# Altium footprint library capacitors.PcbLib: 59 footprints (part 3 of 4)
Each footprint in its own frame and in the unit in brackets; x right, y up, seen from the top. Pads: shape width x height; smd on the part's side, far side on the other; paste and mask are expansions set on the pad; w line width, h text height; cw(c..) or ccw(c..) is an arc to the next point about the centre after c.
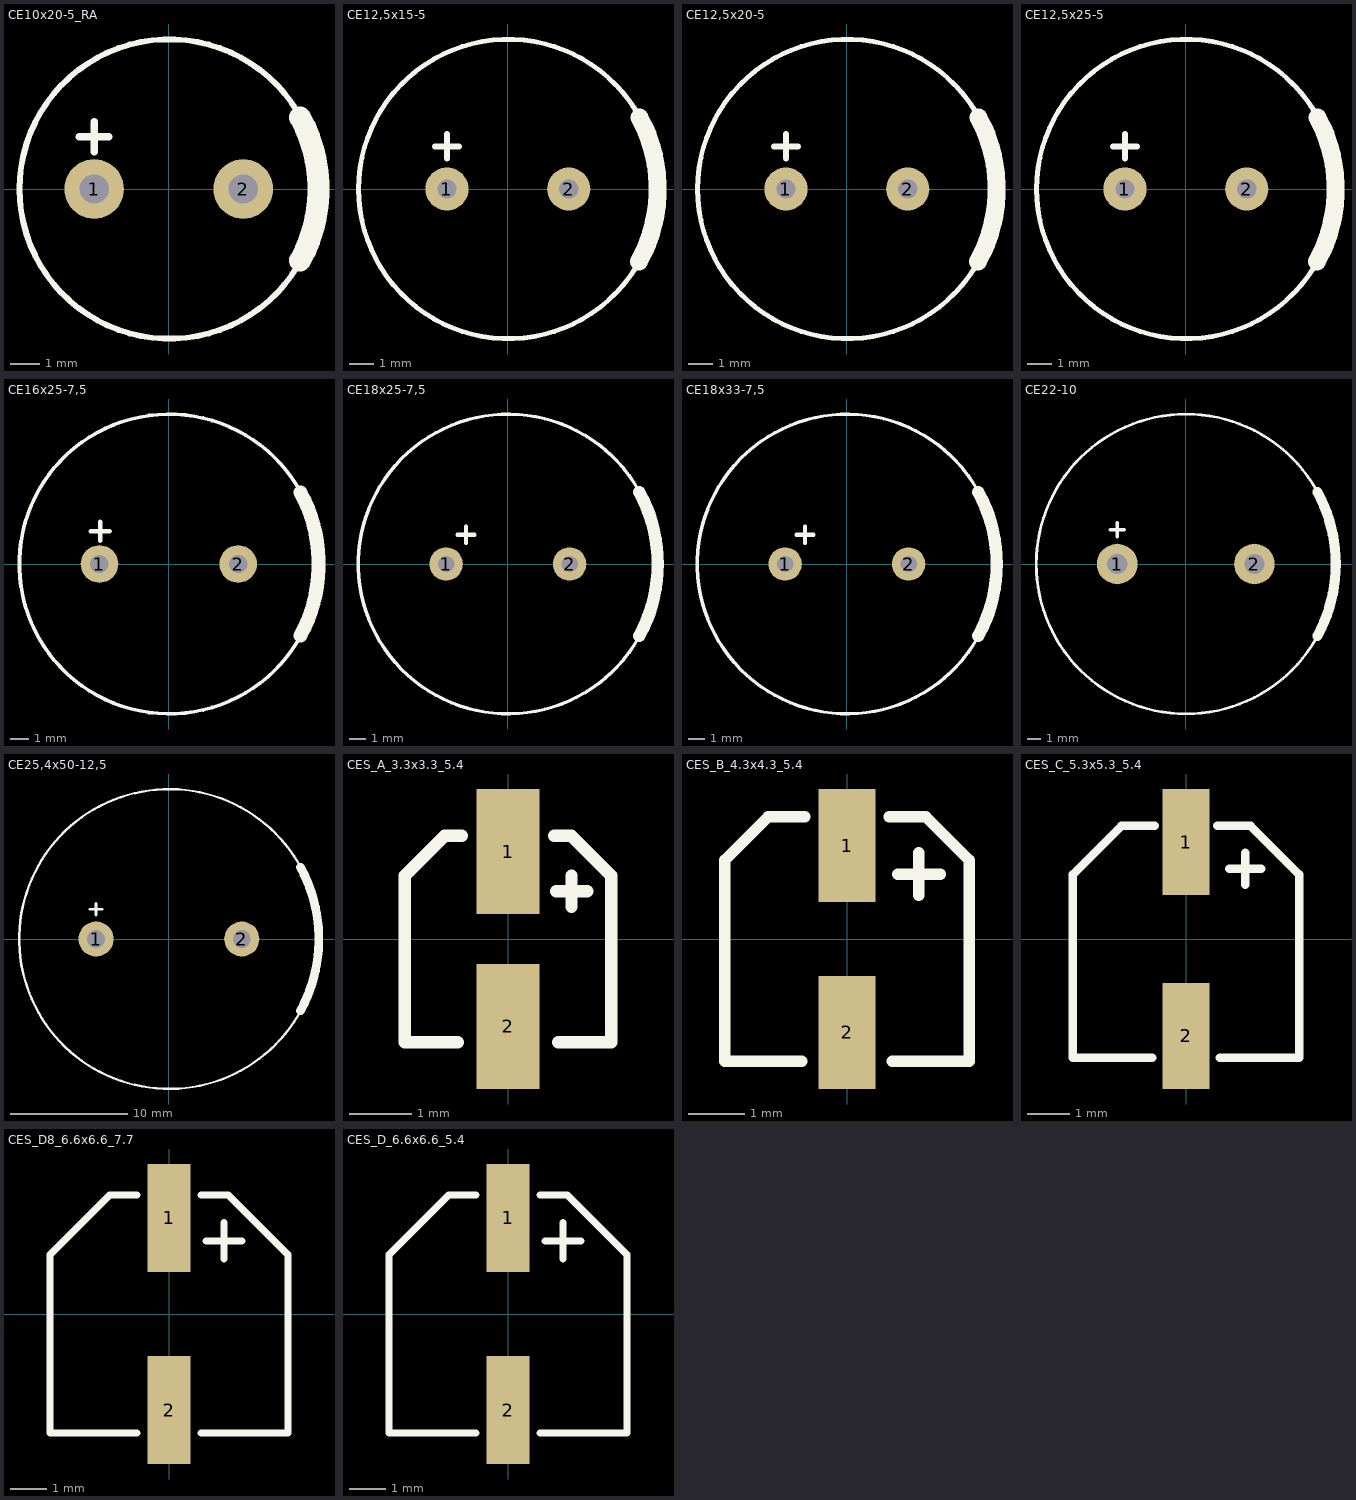
[diagram p2: the footprints below, top view; thin cyan lines are the x and y axes]

## CE10x20-5_RA [mil] "Aluminium Electrolytic Capacitor -  Radius: 10mm, Height: 20mm, PinSpacing: 5mm, Right Angle"
height 393.7
pads (2):
  round 80 hole 39.37: 1(-100,0) 2(100,0)
Top Overlay:
  circle w7.87: c0.72,0 r200.79
  lines w9.84: -120,70 -80,70 ; -100,50 -100,90
  lines w29.53: 176.27,-96.15 ccw(c0,0) 176.27,96.15
3D body "User Library-Cap electro 10x20x5_0mm RA.STEP": height 394.7, standoff -66.14, extent -197.85,-14.76 197.85,853.02

## CE12,5x15-5 [mm] "Aluminium Electrolytic Capacitor -  Radius: 12,5mm, Height: 15mm, PinSpacing: 5mm"
height 15
pads (2):
  round 1.8 hole 0.8: 1(-2.54,0) 2(2.54,0)
Top Overlay:
  circle w0.2: c0.018,0 r6.242
  lines w0.25: -3.048,1.778 -2.032,1.778 ; -2.54,1.27 -2.54,2.286
  lines w0.75: 5.473,-3.015 ccw(c0,0) 5.496,2.973
3D body "User Library-Cap 12.5x15.STEP": height 15.5, standoff -2, extent -6.25,-6.25 6.25,6.25

## CE12,5x20-5 [mm] "Aluminium Electrolytic Capacitor -  Radius: 12,5mm, Height: 20mm, PinSpacing: 5mm"
height 20
pads (2):
  round 1.8 hole 0.8: 1(-2.54,0) 2(2.54,0)
Top Overlay:
  circle w0.2: c0.018,0 r6.242
  lines w0.25: -3.048,1.778 -2.032,1.778 ; -2.54,1.27 -2.54,2.286
  lines w0.75: 5.473,-3.015 ccw(c0,0) 5.496,2.973
3D body "User Library-Cap12.5x20.STEP": height 1.5, standoff -20.49, extent -6.25,-6.25 6.25,6.25

## CE12,5x25-5 [mm] "Aluminium Electrolytic Capacitor -  Radius: 12,5mm, Height: 25mm, PinSpacing: 5mm"
height 25
pads (2):
  round 1.8 hole 0.8: 1(-2.54,0) 2(2.54,0)
Top Overlay:
  circle w0.2: c0.018,0 r6.242
  lines w0.25: -3.048,1.778 -2.032,1.778 ; -2.54,1.27 -2.54,2.286
  lines w0.75: 5.473,-3.015 ccw(c0,0) 5.496,2.973
3D body "User Library-Cap12.5x25.STEP": height 24.99, standoff -2, extent -6.252,-6.25 6.248,6.25

## CE16x25-7,5 [mm] "Aluminium Electrolytic Capacitor -  Radius: 16mm, Height: xx mm, PinSpacing: 7,5mm"
height 20
pads (2):
  round 2.032 hole 1: 1(-3.75,0) 2(3.75,0)
Top Overlay:
  circle w0.2: c0.018,0 r8.1
  lines w0.25: -4.223,1.778 -3.207,1.778 ; -3.715,1.27 -3.715,2.286
  lines w0.75: 7.111,-3.879 ccw(c0,0) 7.111,3.879
3D body "User Library-Cap16x25.STEP": height 25, standoff -2, extent -8,-8 8,8

## CE18x25-7,5 [mm] "Aluminium Electrolytic Capacitor -  Radius: 18mm, Height: xx mm, PinSpacing: 7,5mm"
height 20
pads (2):
  round 2.032 hole 1: 1(-3.75,0) 2(3.75,0)
Top Overlay:
  circle w0.2: c0.018,0 r9.1
  lines w0.25: -3.048,1.778 -2.032,1.778 ; -2.54,1.27 -2.54,2.286
  lines w0.75: 7.989,-4.357 ccw(c0,0) 7.989,4.357
3D body "User Library-cap 18x25.STEP": height 26, standoff -2, extent -8.983,-9 9.017,9

## CE18x33-7,5 [mm] "Aluminium Electrolytic Capacitor -  Radius: 18mm, Height: xx mm, PinSpacing: 7,5mm"
height 20
pads (2):
  round 2.032 hole 1: 1(-3.75,0) 2(3.75,0)
Top Overlay:
  circle w0.2: c0.018,0 r9.1
  lines w0.25: -3.048,1.778 -2.032,1.778 ; -2.54,1.27 -2.54,2.286
  lines w0.75: 7.989,-4.357 ccw(c0,0) 7.989,4.357
3D body "User Library-Capacitor 18x33_5mm.step": height 33.51, standoff -6, extent -9.025,-9 8.985,9

## CE22-10 [mm] "Aluminium Electrolytic Capacitor -  Radius: 22mm, Height: xx mm, PinSpacing: 10mm"
height 40
pads (2):
  round 3 hole 1.5: 1(-5.08,0) 2(5.08,0)
Top Overlay:
  circle w0.2: c0.018,0 r11.1
  lines w0.25: -5.588,2.54 -4.572,2.54 ; -5.08,2.032 -5.08,3.048
  lines w0.75: 9.745,-5.315 ccw(c0,0) 9.745,5.315

## CE25,4x50-12,5 [mm] "Aluminium Electrolytic Capacitor -  Radius: 25,4mm, Height: xx mm, PinSpacing: 12,5mm"
height 40
pads (2):
  round 3 hole 1.5: 1(-6.223,0) 2(6.223,0)
Top Overlay:
  circle w0.2: c0.018,0 r12.8
  lines w0.25: -6.731,2.54 -5.715,2.54 ; -6.223,2.032 -6.223,3.048
  lines w0.75: 11.237,-6.129 ccw(c0,0) 11.237,6.129
3D body "User Library-Cap 25x50.STEP": height 50, standoff -2, extent -12.6,-12.5 12.4,12.5

## CE45X8 [mm]
3D body "User Library-RC2-50V3R3KD1 #T2.step": height 6.95, standoff 2.45, extent -11.833,-7.276 10.667,-2.326

## CE85X125 [mm]
3D body "User Library-GXE10VB221MX12LL.step": height 8.95, standoff 0.45, extent -20.194,-5.266 10.806,3.234

## CES_A_3.3x3.3_5.4 [mm] "Electrolit Capacitor A Size; base: 3.3x3.3mm, height: 5.4mm"
height 5.4
pads (2):
  rect 1x2 smd: 1(0,1.4) 2(0,-1.4)
Top Overlay:
  lines w0.2: -0.8,-1.651 -1.651,-1.651 -1.651,1.016 -1.016,1.651 -0.742,1.651 ; 0.742,1.651 1.016,1.651 1.651,1.016 1.651,-1.651 0.8,-1.651 ; 0.77,0.762 1.27,0.762 ; 1.016,0.516 1.016,1.016
3D body "User Library-ALU-A.STEP": height 5.4, standoff 0, extent -1.65,-1.8 1.65,1.8

## CES_B_4.3x4.3_5.4 [mm] "SMT Aluminum Electrolytic Capacitor, B Size; base: 4.3x4.3mm, height: 5.4mm"
height 5.4
pads (2):
  rect 1x2 smd: 1(0,1.651) 2(0,-1.651)
Top Overlay:
  lines w0.2: -0.8,-2.159 -2.159,-2.159 -2.159,1.397 -1.397,2.159 -0.742,2.159 ; 0.742,2.159 1.397,2.159 2.159,1.397 2.159,-2.159 0.8,-2.159 ; 0.897,1.143 1.651,1.143 ; 1.27,0.77 1.27,1.524
3D body "User Library-ALU-B.STEP": height 5.4, standoff 0, extent -2.15,-2.3 2.15,2.3

## CES_C_5.3x5.3_5.4 [mm] "SMT Aluminum Electrolytic Capacitor, C Size; base: 5.3x5.3mm, height: 5.4mm"
height 5.4
pads (2):
  rect 1.1x2.5 smd: 1(0,2.286) 2(0,-2.286)
Top Overlay:
  lines w0.2: -0.8,-2.794 -2.667,-2.794 -2.667,1.524 -1.524,2.667 -0.742,2.667 ; 0.742,2.667 1.524,2.667 2.667,1.524 2.667,-2.794 0.8,-2.794 ; 1.024,1.651 1.778,1.651 ; 1.397,1.278 1.397,2.032
3D body "User Library-ALU-C.STEP": height 5.41, standoff 0, extent -2.65,-2.95 2.65,2.95

## CES_D8_6.6x6.6_7.7 [mm] "SMT Aluminum Electrolytic Capacitor, D8 Size; base: 6.6x6.6mm, height: 7.7mm"
height 7.7
pads (2):
  rect 1.2x3 smd: 1(0,2.667) 2(0,-2.667)
Top Overlay:
  lines w0.2: -0.889,-3.302 -3.302,-3.302 -3.302,1.651 -1.651,3.302 -0.889,3.302 ; 0.889,-3.302 3.302,-3.302 3.302,1.651 1.651,3.302 0.889,3.302 ; 1.024,2.032 2.032,2.032 ; 1.524,1.532 1.524,2.54
3D body "User Library-ALU-D8.STEP": height 7.7, standoff 0, extent -3.3,-3.5 3.3,3.5

## CES_D_6.6x6.6_5.4 [mm] "SMT Aluminum Electrolytic Capacitor, D Size; base: 6.6x6.6mm, height: 5.4mm"
height 5.4
pads (2):
  rect 1.2x3 smd: 1(0,2.667) 2(0,-2.667)
Top Overlay:
  lines w0.2: -0.889,-3.302 -3.302,-3.302 -3.302,1.651 -1.651,3.302 -0.889,3.302 ; 0.889,-3.302 3.302,-3.302 3.302,1.651 1.651,3.302 0.889,3.302 ; 1.024,2.032 2.032,2.032 ; 1.524,1.532 1.524,2.54
3D body "User Library-ALU-D.STEP": height 5.4, standoff 0, extent -3.3,-3.5 3.3,3.5